# Altium footprint library PcbLib1.PcbLib: 136 footprints (part 9 of 9)
Each footprint in its own frame and in the unit in brackets; x right, y up, seen from the top. Pads: shape width x height; smd on the part's side, far side on the other; paste and mask are expansions set on the pad; w line width, h text height; cw(c..) or ccw(c..) is an arc to the next point about the centre after c.
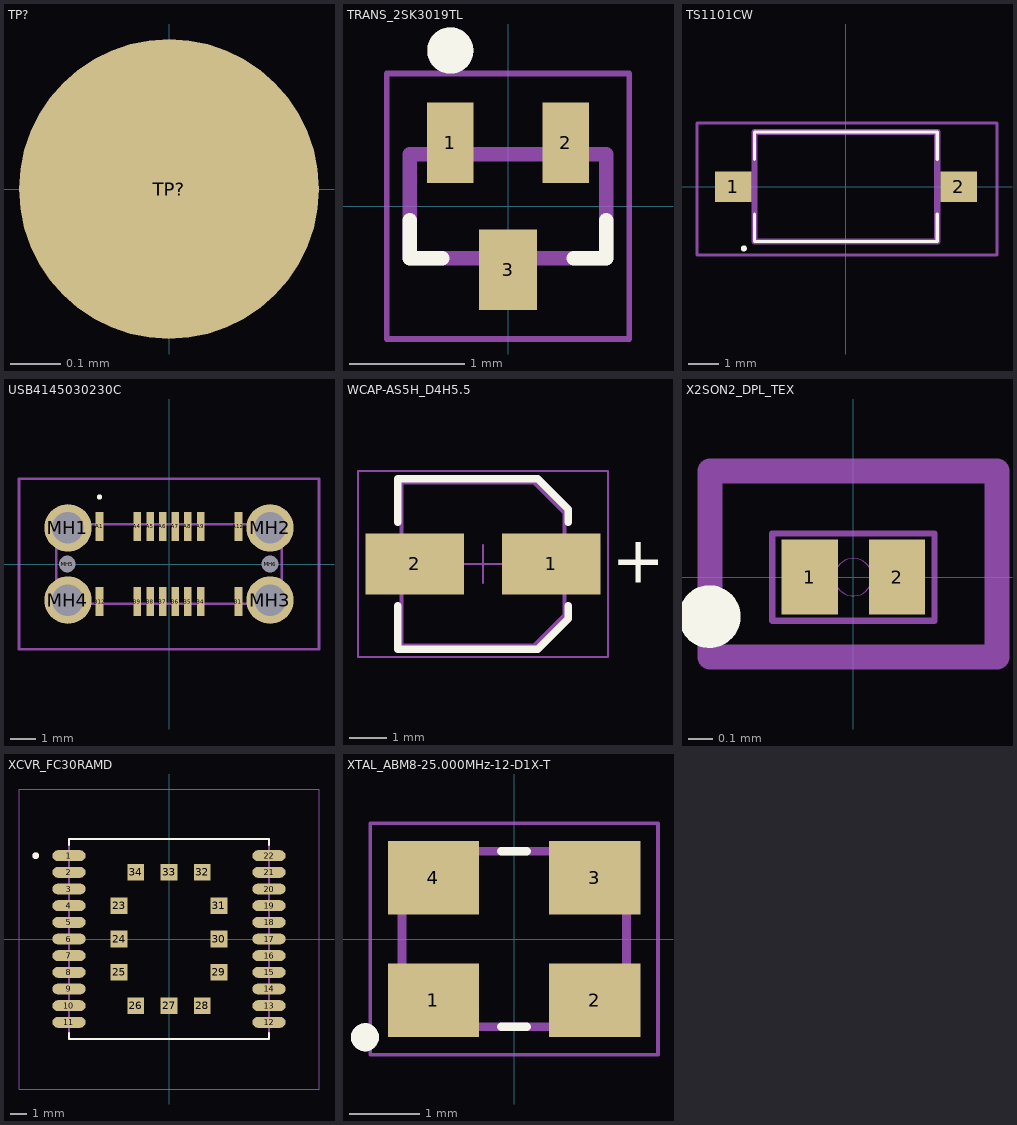
[diagram p8: the footprints below, top view; thin cyan lines are the x and y axes]

## TP? [mm] "TEST PAD 0.6MM DIA"
pads (1):
  round 0.6 smd: TP?(0,0)

## TRANS_2SK3019TL [mm]
pads (3):
  rect 0.4x0.7 smd: 1(-0.5,0.55) 2(0.5,0.55)
  rect 0.5x0.7 smd: 3(0,-0.55)
Top Overlay:
  circle w0.2: c-0.5,1.35 r0.1
  lines w0.127: -0.85,-0.12 -0.85,-0.45 -0.57,-0.45 ; 0.57,-0.45 0.85,-0.45 0.85,-0.12
Mechanical 13:
  circle w0.2: c-0.5,1.35 r0.1
  lines w0.127: -0.85,-0.45 0.85,-0.45 0.85,0.45 -0.85,0.45 -0.85,-0.45
Mechanical 15:
  lines w0.05: -1.05,-1.15 -1.05,1.15 1.05,1.15 1.05,-1.15 -1.05,-1.15
3D body "step_temp.STEP": height 0.8, standoff 0, extent -0.8,-0.8 0.8,0.8

## TS1101CW [mm]
pads (2):
  rect 1.2x1 smd: 1(-3.7,0) 2(3.7,0)
Top Overlay:
  lines w0.1: -3,-0.9 -3,-1.8 3,-1.8 3,-0.9 ; -3,0.9 -3,1.8 3,1.8 3,0.9 ; -3.4,-2.025 ccw(c-3.35,-2.025) -3.3,-2.025 ccw(c-3.35,-2.025) -3.4,-2.025
Mechanical 13:
  lines w0.2: -3,-1.8 3,-1.8 3,1.8 -3,1.8 -3,-1.8
Mechanical 15:
  lines w0.1: -4.886,-2.241 4.962,-2.241 4.962,2.096 -4.886,2.096 -4.886,-2.241
3D body "TS-1101-C-W.stp": height 2.5, standoff 0, extent -4,-1.8 4,1.8

## USB4145030230C [mm] "C-TYPE USB-Vertical view"
pads (22):
  rect 0.3x1.15 smd: A1(-2.75,1.485) A4(-1.25,1.485) A5(-0.75,1.485) A6(-0.25,1.485) A7(0.25,1.485) A8(0.75,1.485) A9(1.25,1.485) A12(2.75,1.485) B1(2.75,-1.485) B4(1.25,-1.485) B5(0.75,-1.485) B6(0.25,-1.485) B7(-0.25,-1.485) B8(-0.75,-1.485) B9(-1.25,-1.485) B12(-2.75,-1.485)
  round 1.875 hole 1.25: MH1(-4,1.43) MH2(4,1.43) MH3(4,-1.43) MH4(-4,-1.43)
  round 0.54 hole 0.66 unplated: MH5(-4.025,0) MH6(4,0)
Top Overlay:
  lines w0.1: -2.75,2.6 cw(c-2.75,2.65) -2.75,2.7 cw(c-2.75,2.65) -2.75,2.6
Mechanical 13:
  lines w0.1: -4.47,-1.58 -4.47,1.58 4.47,1.58 4.47,-1.58 -4.47,-1.58
Mechanical 15:
  lines w0.1: -5.938,-3.367 -5.938,3.367 5.938,3.367 5.938,-3.367 -5.938,-3.367
3D body "USB4145-03-0230-C.stp": height 7.46, standoff -2.3, extent -4.475,-1.855 4.47,1.835

## WCAP-AS5H_D4H5.5 [mm]
pads (2):
  rect 2.6x1.6 smd: 1(-1268.2,-1270) 2(-1271.8,-1270)
Top Overlay:
  lines w0.2: -1272.25,-1271.1 -1272.25,-1272.25 -1268.55,-1272.25 -1267.75,-1271.45 -1267.75,-1271.1 ; -1272.25,-1268.9 -1272.25,-1267.75 -1268.55,-1267.75 -1267.75,-1268.55 -1267.75,-1268.9
  text "+" at -1266.6,-1270.5 h1.22
Top Courtyard:
  lines w0.05: -1270.5,-1270 -1269.5,-1270 ; -1270,-1270.5 -1270,-1269.5 ; -1273.3,-1272.45 -1273.3,-1267.55 -1266.7,-1267.55 -1266.7,-1272.45 -1273.3,-1272.45
Top 3D Body:
  lines w0.1: -1272.15,-1272.15 -1272.15,-1267.85 -1268.65,-1267.85 -1267.85,-1268.65 -1267.85,-1271.35 -1268.65,-1272.15 -1272.15,-1272.15
Top Component Outline:
  lines w0.1: -1272.15,-1272.15 -1268.65,-1272.15 -1267.85,-1271.35 -1267.85,-1268.65 -1268.65,-1267.85 -1272.15,-1267.85 -1272.15,-1272.15
Top Designator:
  text ".Designator" at -1275.996,-1270.398 h1.2
3D body "4x5.5x1.stp": height 5.5, standoff 0, extent -1272.5,-1272.15 -1267.5,-1267.85

## X2SON2_DPL_TEX [mil]
pads (2):
  rect 9x12 smd paste+0 mask+0: 1(-7,0) 2(7,0)
Top Overlay:
  circle w6: c-23.06,-6.33 r2
Mechanical 13:
  circle w0: c0,0 r3
  lines w1: -13,-7 -13,7 13,7 13,-7 -13,-7
  text "RefDes2" at -13.78,8.86 h4
Mechanical 15:
  lines w3.99: -23,-12.8 -23,17 23,17 23,-12.8 -23,-12.8
3D body "X2SON2_DPL_TEX.step": height 13.11, standoff 0, extent -12.99,-7.01 12.99,7.01

## XCVR_FC30RAMD [mm]
pads (34):
  oval 2x0.65 smd: 1(-6,5) 2(-6,4) 3(-6,3) 4(-6,2) 5(-6,1) 6(-6,0) 7(-6,-1) 8(-6,-2) 9(-6,-3) 10(-6,-4) 11(-6,-5) 12(6,-5) 13(6,-4) 14(6,-3) 15(6,-2) 16(6,-1) 17(6,0) 18(6,1) 19(6,2) 20(6,3) 21(6,4) 22(6,5)
  rect 1x1 smd: 23(-3,2) 24(-3,0) 25(-3,-2) 26(-2,-4) 27(0,-4) 28(2,-4) 29(3,-2) 30(3,0) 31(3,2) 32(2,4) 33(0,4) 34(-2,4)
Top Overlay:
  circle w0.2: c-8,5 r0.1
  lines w0.127: -6,-5.645 -6,-6 6,-6 6,-5.645 ; -6,5.645 -6,6 6,6 6,5.645
Top Courtyard:
  lines w0.05: -9,-9 -9,9 9,9 9,-9 -9,-9
Top 3D Body:
  circle w0.2: c-8,5 r0.1
  lines w0.127: -6,-6 -6,6 6,6 6,-6 -6,-6
3D body "step_temp.STEP": height 2.3, standoff 0, extent -6,-6 6,6

## XTAL_ABM8-25.000MHz-12-D1X-T [mm]
height 0.8
pads (4):
  rect 1.3x1.05 smd: 1(-1.15,-0.875) 2(1.15,-0.875) 3(1.15,0.875) 4(-1.15,0.875)
Top Overlay:
  circle w0.2: c-2.125,-1.4 r0.1
  lines w0.127: -0.18,-1.25 0.18,-1.25 ; -0.18,1.25 0.18,1.25
Mechanical 13:
  circle w0.2: c-2.125,-1.4 r0.1
  lines w0.127: -1.6,-1.25 -1.6,1.25 1.6,1.25 1.6,-1.25 -1.6,-1.25
Mechanical 15:
  lines w0.05: -2.05,-1.65 -2.05,1.65 2.05,1.65 2.05,-1.65 -2.05,-1.65
3D body "step_temp.STEP": height 0.8, standoff 0, extent -1.6,-1.25 1.6,1.25